# Altium footprint library 3D_MIG_Controller.PCBLIB: 560 footprints (part 18 of 35)
Each footprint in its own frame and in the unit in brackets; x right, y up, seen from the top. Pads: shape width x height; smd on the part's side, far side on the other; paste and mask are expansions set on the pad; w line width, h text height; cw(c..) or ccw(c..) is an arc to the next point about the centre after c.
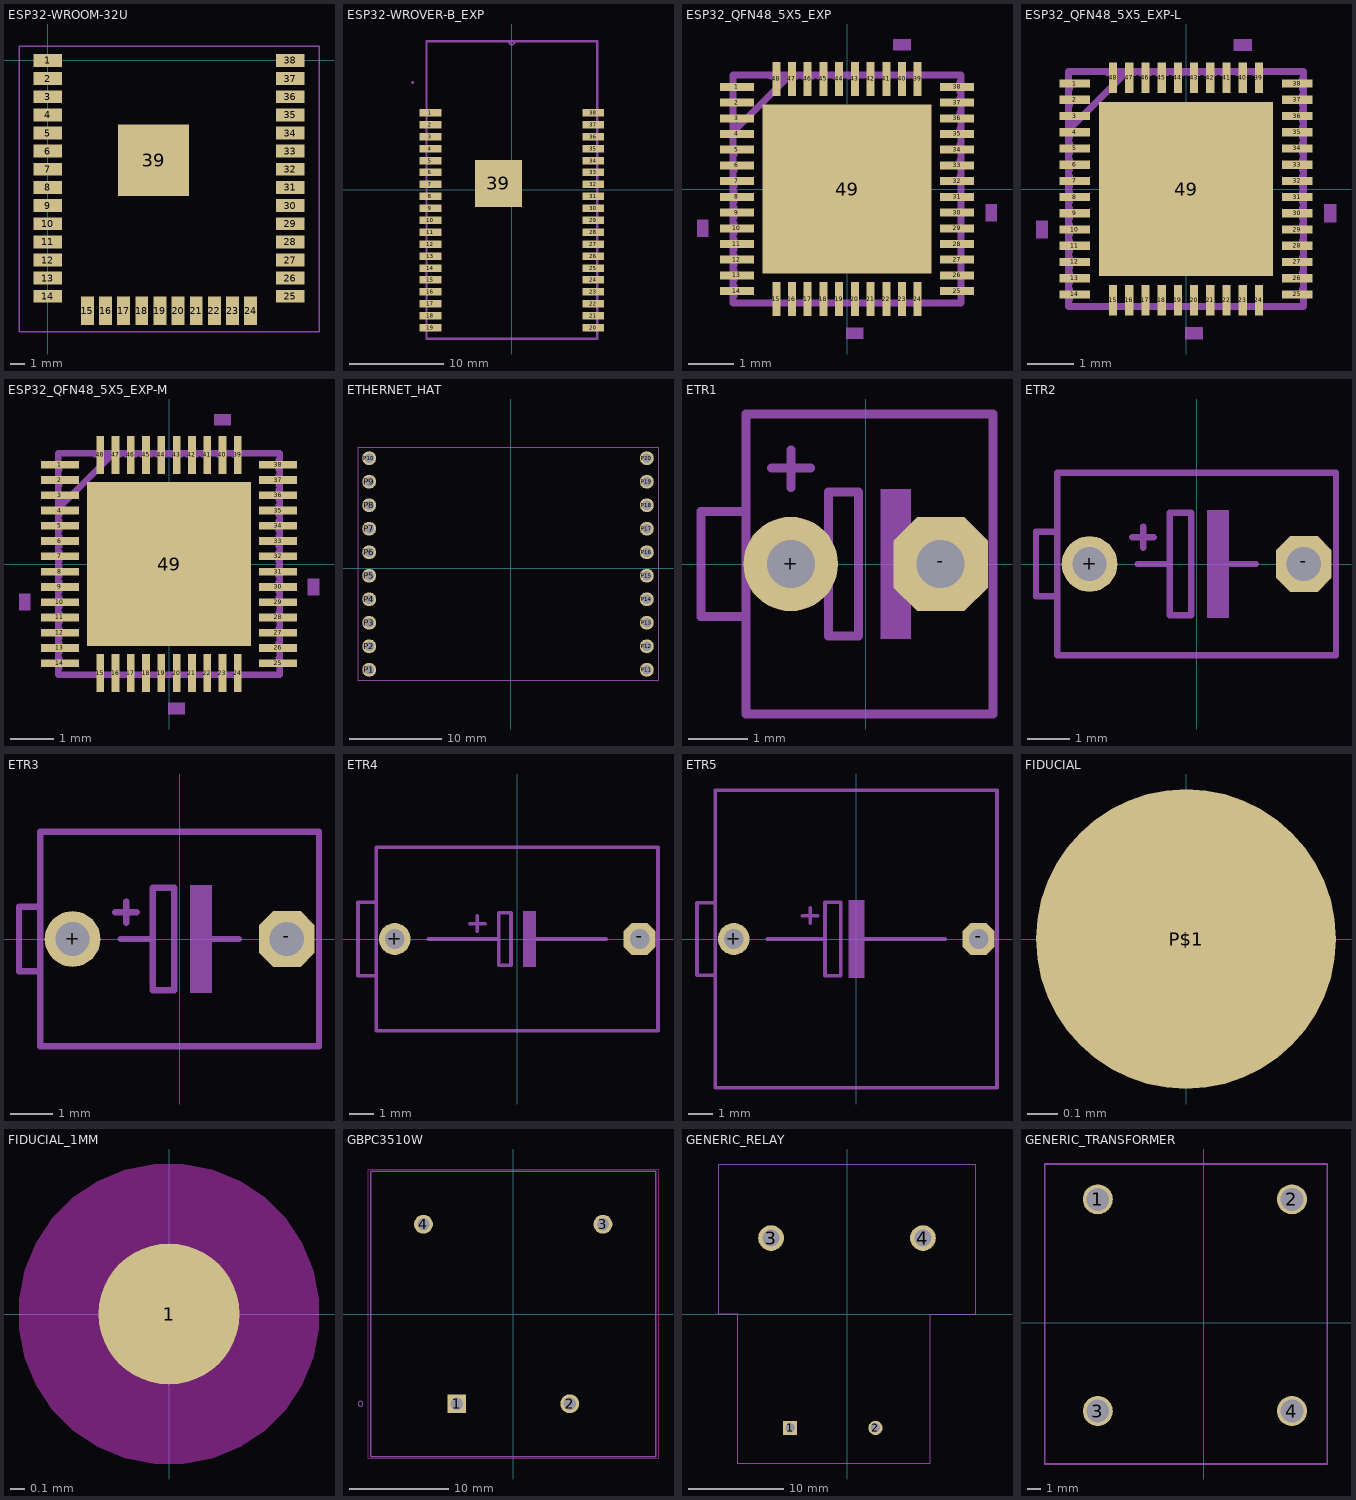
[diagram p17: the footprints below, top view; thin cyan lines are the x and y axes]

## ESP32-WROOM-32U [mm]
pads (39):
  rect 2x0.9 smd: 1(0,0) 2(0,-1.27) 3(0,-2.54) 4(0,-3.81) 5(0,-5.08) 6(0,-6.35) 7(0,-7.62) 8(0,-8.89) 9(0,-10.16) 10(0,-11.43) 11(0,-12.7) 12(0,-13.97) 13(0,-15.24) 14(0,-16.51) 25(17,-16.51) 26(17,-15.24) 27(17,-13.97) 28(17,-12.7) 29(17,-11.43) 30(17,-10.16) 31(17,-8.89) 32(17,-7.62) 33(17,-6.35) 34(17,-5.08) 35(17,-3.81) 36(17,-2.54) 37(17,-1.27) 38(17,0)
  rect 0.9x2 smd: 15(2.785,-17.51) 16(4.055,-17.51) 17(5.325,-17.51) 18(6.595,-17.51) 19(7.865,-17.51) 20(9.135,-17.51) 21(10.405,-17.51) 22(11.675,-17.51) 23(12.945,-17.51) 24(14.215,-17.51)
  rect 5x5 smd: 39(7.415,-7)
tPlace:
  lines w0.1: -2,-19 -2,1 19,1 19,-19 -2,-19
  text "*" at 1.7,-1.3 h2.6

## ESP32-WROVER-B_EXP [mm]
pads (39):
  rect 2.305x0.798 smd: 1(-8.653,8.21) 2(-8.653,6.94) 3(-8.653,5.67) 4(-8.653,4.4) 5(-8.653,3.13) 6(-8.653,1.86) 7(-8.653,0.59) 8(-8.653,-0.68) 9(-8.653,-1.95) 10(-8.653,-3.22) 11(-8.653,-4.49) 12(-8.653,-5.76) 13(-8.653,-7.03) 14(-8.653,-8.3) 15(-8.653,-9.57) 16(-8.653,-10.84) 17(-8.653,-12.11) 18(-8.653,-13.38) 19(-8.653,-14.65) 20(8.653,-14.65) 21(8.653,-13.38) 22(8.653,-12.11) 23(8.653,-10.84) 24(8.653,-9.57) 25(8.653,-8.3) 26(8.653,-7.03) 27(8.653,-5.76) 28(8.653,-4.49) 29(8.653,-3.22) 30(8.653,-1.95) 31(8.653,-0.68) 32(8.653,0.59) 33(8.653,1.86) 34(8.653,3.13) 35(8.653,4.4) 36(8.653,5.67) 37(8.653,6.94) 38(8.653,8.21)
  rect 5x5 smd paste+0: 39(-1.43,0.71)
Top Paste:
  region: -2.4,2.4 -2.4,0.933 -0.933,0.933 -0.933,2.4
  region: -2.4,0.733 -2.4,-0.733 -0.933,-0.733 -0.933,0.733
  region: -2.4,-0.933 -2.4,-2.4 -0.933,-2.4 -0.933,-0.933
  region: -0.733,2.4 -0.733,0.933 0.733,0.933 0.733,2.4
  region: -0.733,0.733 -0.733,-0.733 0.733,-0.733 0.733,0.733
  region: -0.733,-0.933 -0.733,-2.4 0.733,-2.4 0.733,-0.933
  region: 0.933,2.4 0.933,0.933 2.4,0.933 2.4,2.4
  region: 0.933,0.733 0.933,-0.733 2.4,-0.733 2.4,0.733
  region: 0.933,-0.933 0.933,-2.4 2.4,-2.4 2.4,-0.933
tDocu:
  lines w0.152: -0.305,15.748 0.305,15.748 ; -0.305,15.748 -9.042,15.748 -9.042,-15.748 9.042,-15.748 9.042,15.748 0.305,15.748 ; -0.305,15.748 ccw(c0,15.748) 0.305,15.748
  text "*" at -9.22,7.569 h1.97
tPlace:
  lines w0.152: -9.119,-15.037 -9.119,-15.85 9.119,-15.85 9.119,-15.037 ; -9.119,-14.249 -9.119,-13.767 ; -9.119,-12.979 -9.119,-12.497 ; -9.119,-11.709 -9.119,-11.227 ; -9.119,-10.439 -9.119,-9.957 ; -9.119,-9.169 -9.119,-8.687 ; -9.119,-7.899 -9.119,-7.417 ; -9.119,-6.629 -9.119,-6.147 ; -9.119,-5.359 -9.119,-4.877 ; -9.119,-4.089 -9.119,-3.607 ; -9.119,-2.819 -9.119,-2.337 ; -9.119,-1.549 -9.119,-1.067 ; -9.119,-0.279 -9.119,0.203 ; -9.119,0.991 -9.119,1.473 ; -9.119,2.261 -9.119,2.743 ; -9.119,3.531 -9.119,4.013 ; -9.119,4.801 -9.119,5.283 ; -9.119,6.071 -9.119,6.553 ; -9.119,7.341 -9.119,7.823 ; -9.119,8.611 -9.119,15.85 9.119,15.85 9.119,8.611 ; 9.119,-14.249 9.119,-13.767 ; 9.119,-12.979 9.119,-12.497 ; 9.119,-11.709 9.119,-11.227 ; 9.119,-10.439 9.119,-9.957 ; 9.119,-9.169 9.119,-8.687 ; 9.119,-7.899 9.119,-7.417 ; 9.119,-6.629 9.119,-6.147 ; 9.119,-5.359 9.119,-4.877 ; 9.119,-4.089 9.119,-3.607 ; 9.119,-2.819 9.119,-2.337 ; 9.119,-1.549 9.119,-1.067 ; 9.119,-0.279 9.119,0.203 ; 9.119,0.991 9.119,1.473 ; 9.119,2.261 9.119,2.743 ; 9.119,3.531 9.119,4.013 ; 9.119,4.801 9.119,5.283 ; 9.119,6.071 9.119,6.553 ; 9.119,7.341 9.119,7.823 ; -10.617,11.43 ccw(c-10.541,11.43) -10.465,11.43 ccw(c-10.541,11.43) -10.617,11.43
  text "*" at -9.22,7.569 h1.97
bPlace:
  text "*" at -9.22,7.569 h1.97

## ESP32_QFN48_5X5_EXP [mil]
pads (49):
  rect 30x7 smd: 1(-96.5,89.57) 2(-96.5,75.79) 3(-96.5,62.01) 4(-96.5,48.23) 5(-96.5,34.45) 6(-96.5,20.67) 7(-96.5,6.89) 8(-96.5,-6.89) 9(-96.5,-20.67) 10(-96.5,-34.45) 11(-96.5,-48.23) 12(-96.5,-62.01) 13(-96.5,-75.79) 14(-96.5,-89.57) 25(96.5,-89.57) 26(96.5,-75.79) 27(96.5,-62.01) 28(96.5,-48.23) 29(96.5,-34.45) 30(96.5,-20.67) 31(96.5,-6.89) 32(96.5,6.89) 33(96.5,20.67) 34(96.5,34.45) 35(96.5,48.23) 36(96.5,62.01) 37(96.5,75.79) 38(96.5,89.57)
  rect 7x30 smd: 15(-62.01,-96.5) 16(-48.23,-96.5) 17(-34.45,-96.5) 18(-20.67,-96.5) 19(-6.89,-96.5) 20(6.89,-96.5) 21(20.67,-96.5) 22(34.45,-96.5) 23(48.23,-96.5) 24(62.01,-96.5) 39(62.01,96.5) 40(48.23,96.5) 41(34.45,96.5) 42(20.67,96.5) 43(6.89,96.5) 44(-6.89,96.5) 45(-20.67,96.5) 46(-34.45,96.5) 47(-48.23,96.5) 48(-62.01,96.5)
  rect 148x148 smd paste+0: 49(0,0)
Top Paste:
  region: -70.06,70.06 -70.06,3.94 -3.94,3.94 -3.94,70.06
  region: -70.06,-3.94 -70.06,-70.06 -3.94,-70.06 -3.94,-3.94
  region: 3.94,70.06 3.94,3.94 70.06,3.94 70.06,70.06
  region: 3.94,-3.94 3.94,-70.06 70.06,-70.06 70.06,-3.94
tDocu:
  lines w6: -100,11 -99,2 ; -100,25 -99,16 ; -100,39 -99,30 ; -100,44 -100,53 ; -100,50 -50,100 ; -100,58 -100,67 ; -100,71 -100,80 ; -100,85 -100,94 ; -99,-94 -99,-85 ; -99,-80 -99,-71 ; -99,-67 -99,-58 ; -99,-53 -99,-44 ; -99,-39 -99,-30 ; -99,-25 -99,-16 ; -99,-11 -99,-2 ; -67,-100 -58,-100 ; -67,99 -58,99 ; -53,-100 -44,-100 ; -53,99 -44,99 ; -39,-100 -30,-100 ; -39,99 -30,99 ; -25,-100 -16,-100 ; -25,99 -16,100 ; -11,-100 -2,-100 ; -11,99 -2,100 ; 2,-100 11,-100 ; 2,99 11,100 ; 16,-100 25,-100 ; 16,100 25,100 ; 30,-100 39,-100 ; 30,100 39,100 ; 44,-100 53,-100 ; 44,100 53,100 ; 58,-100 67,-100 ; 58,100 67,100 ; 99,11 100,2 ; 99,25 100,16 ; 99,39 100,30 ; 99,53 100,44 ; 99,67 100,58 ; 99,80 100,71 ; 99,85 99,94 ; 100,-94 100,-85 ; 100,-80 100,-71 ; 100,-67 100,-58 ; 100,-53 100,-44 ; 100,-39 100,-30 ; 100,-25 100,-16 ; 100,-11 100,-2 ; -100,-100 100,-100 100,100 -100,100 -100,-100
  text "*" at -104,71 h77.5
tPlace:
  region: -131.5,-26.95 -131.5,-41.95 -121.5,-41.95 -121.5,-26.95
  region: -0.61,-121.5 -0.61,-131.5 14.39,-131.5 14.39,-121.5
  region: 131.5,-13.17 131.5,-28.17 121.5,-28.17 121.5,-13.17
  region: 40.73,121.5 40.73,131.5 55.73,131.5 55.73,121.5
  text "*" at -159,71 h77.5

## ESP32_QFN48_5X5_EXP-L [mil]
pads (49):
  rect 26x7 smd: 1(-94.5,89.57) 2(-94.5,75.79) 3(-94.5,62.01) 4(-94.5,48.23) 5(-94.5,34.45) 6(-94.5,20.67) 7(-94.5,6.89) 8(-94.5,-6.89) 9(-94.5,-20.67) 10(-94.5,-34.45) 11(-94.5,-48.23) 12(-94.5,-62.01) 13(-94.5,-75.79) 14(-94.5,-89.57) 25(94.5,-89.57) 26(94.5,-75.79) 27(94.5,-62.01) 28(94.5,-48.23) 29(94.5,-34.45) 30(94.5,-20.67) 31(94.5,-6.89) 32(94.5,6.89) 33(94.5,20.67) 34(94.5,34.45) 35(94.5,48.23) 36(94.5,62.01) 37(94.5,75.79) 38(94.5,89.57)
  rect 7x26 smd: 15(-62.01,-94.5) 16(-48.23,-94.5) 17(-34.45,-94.5) 18(-20.67,-94.5) 19(-6.89,-94.5) 20(6.89,-94.5) 21(20.67,-94.5) 22(34.45,-94.5) 23(48.23,-94.5) 24(62.01,-94.5) 39(62.01,94.5) 40(48.23,94.5) 41(34.45,94.5) 42(20.67,94.5) 43(6.89,94.5) 44(-6.89,94.5) 45(-20.67,94.5) 46(-34.45,94.5) 47(-48.23,94.5) 48(-62.01,94.5)
  rect 148x148 smd paste+0: 49(0,0)
Top Paste:
  region: -70.06,70.06 -70.06,3.94 -3.94,3.94 -3.94,70.06
  region: -70.06,-3.94 -70.06,-70.06 -3.94,-70.06 -3.94,-3.94
  region: 3.94,70.06 3.94,3.94 70.06,3.94 70.06,70.06
  region: 3.94,-3.94 3.94,-70.06 70.06,-70.06 70.06,-3.94
tDocu:
  lines w6: -100,50 -50,100 ; -100,67 -99,58 ; -100,80 -99,71 ; -100,94 -99,85 ; -99,-94 -99,-85 ; -99,-80 -99,-71 ; -99,-67 -99,-58 ; -99,-53 -99,-44 ; -99,-39 -99,-30 ; -99,-25 -99,-16 ; -99,-11 -99,-2 ; -99,2 -99,11 ; -99,16 -99,25 ; -99,30 -99,39 ; -99,44 -99,53 ; -67,-100 -58,-100 ; -67,99 -58,99 ; -53,-100 -44,-100 ; -53,99 -44,99 ; -39,-100 -30,-100 ; -39,99 -30,99 ; -25,-100 -16,-100 ; -25,99 -16,99 ; -11,-100 -2,-100 ; -11,99 -2,99 ; 2,-100 11,-100 ; 2,99 11,99 ; 16,-100 25,-100 ; 16,99 25,99 ; 30,-100 39,-100 ; 30,99 39,100 ; 44,-100 53,-100 ; 44,99 53,100 ; 58,-100 67,-100 ; 58,99 67,100 ; 99,-85 100,-94 ; 99,-71 100,-80 ; 99,-58 100,-67 ; 99,-44 100,-53 ; 99,-30 100,-39 ; 99,-25 99,-16 ; 99,-11 99,-2 ; 99,2 99,11 ; 99,16 99,25 ; 99,30 99,39 ; 99,44 99,53 ; 99,58 99,67 ; 99,71 99,80 ; 99,85 99,94 ; -100,-100 100,-100 100,100 -100,100 -100,-100
  text "*" at -104,71 h77.5
tPlace:
  region: -127.5,-26.95 -127.5,-41.95 -117.5,-41.95 -117.5,-26.95
  region: -0.61,-117.5 -0.61,-127.5 14.39,-127.5 14.39,-117.5
  region: 127.5,-13.17 127.5,-28.17 117.5,-28.17 117.5,-13.17
  region: 40.73,117.5 40.73,127.5 55.73,127.5 55.73,117.5
  text "*" at -155,71 h77.5

## ESP32_QFN48_5X5_EXP-M [mil]
pads (49):
  rect 34x7 smd: 1(-98.5,89.57) 2(-98.5,75.79) 3(-98.5,62.01) 4(-98.5,48.23) 5(-98.5,34.45) 6(-98.5,20.67) 7(-98.5,6.89) 8(-98.5,-6.89) 9(-98.5,-20.67) 10(-98.5,-34.45) 11(-98.5,-48.23) 12(-98.5,-62.01) 13(-98.5,-75.79) 14(-98.5,-89.57) 25(98.5,-89.57) 26(98.5,-75.79) 27(98.5,-62.01) 28(98.5,-48.23) 29(98.5,-34.45) 30(98.5,-20.67) 31(98.5,-6.89) 32(98.5,6.89) 33(98.5,20.67) 34(98.5,34.45) 35(98.5,48.23) 36(98.5,62.01) 37(98.5,75.79) 38(98.5,89.57)
  rect 7x34 smd: 15(-62.01,-98.5) 16(-48.23,-98.5) 17(-34.45,-98.5) 18(-20.67,-98.5) 19(-6.89,-98.5) 20(6.89,-98.5) 21(20.67,-98.5) 22(34.45,-98.5) 23(48.23,-98.5) 24(62.01,-98.5) 39(62.01,98.5) 40(48.23,98.5) 41(34.45,98.5) 42(20.67,98.5) 43(6.89,98.5) 44(-6.89,98.5) 45(-20.67,98.5) 46(-34.45,98.5) 47(-48.23,98.5) 48(-62.01,98.5)
  rect 148x148 smd paste+0: 49(0,0)
Top Paste:
  region: -70.06,70.06 -70.06,3.94 -3.94,3.94 -3.94,70.06
  region: -70.06,-3.94 -70.06,-70.06 -3.94,-70.06 -3.94,-3.94
  region: 3.94,70.06 3.94,3.94 70.06,3.94 70.06,70.06
  region: 3.94,-3.94 3.94,-70.06 70.06,-70.06 70.06,-3.94
tDocu:
  lines w6: -100,50 -50,100 ; -100,67 -99,58 ; -100,80 -99,71 ; -100,94 -99,85 ; -99,-94 -99,-85 ; -99,-80 -99,-71 ; -99,-67 -99,-58 ; -99,-53 -99,-44 ; -99,-39 -99,-30 ; -99,-25 -99,-16 ; -99,-11 -99,-2 ; -99,2 -99,11 ; -99,16 -99,25 ; -99,30 -99,39 ; -99,44 -99,53 ; -67,-100 -58,-100 ; -67,99 -58,99 ; -53,-100 -44,-100 ; -53,99 -44,99 ; -39,-100 -30,-100 ; -39,99 -30,99 ; -25,-100 -16,-100 ; -25,99 -16,99 ; -11,-100 -2,-100 ; -11,99 -2,99 ; 2,-100 11,-100 ; 2,99 11,99 ; 16,-100 25,-100 ; 16,99 25,99 ; 30,-100 39,-100 ; 30,99 39,100 ; 44,-100 53,-100 ; 44,99 53,100 ; 58,-100 67,-100 ; 58,99 67,100 ; 99,-85 100,-94 ; 99,-71 100,-80 ; 99,-58 100,-67 ; 99,-44 100,-53 ; 99,-30 100,-39 ; 99,-25 99,-16 ; 99,-11 99,-2 ; 99,2 99,11 ; 99,16 99,25 ; 99,30 99,39 ; 99,44 99,53 ; 99,58 99,67 ; 99,71 99,80 ; 99,85 99,94 ; -100,-100 100,-100 100,100 -100,100 -100,-100
  text "*" at -104,71 h77.5
tPlace:
  region: -135.5,-26.95 -135.5,-41.95 -125.5,-41.95 -125.5,-26.95
  region: -0.61,-125.5 -0.61,-135.5 14.39,-135.5 14.39,-125.5
  region: 135.5,-13.17 135.5,-28.17 125.5,-28.17 125.5,-13.17
  region: 40.73,125.5 40.73,135.5 55.73,135.5 55.73,125.5
  text "*" at -163,71 h77.5

## ETHERNET_HAT [mm]
pads (20):
  round 1.508 hole 1: P1(-15.3,-10.96) P2(-15.3,-8.42) P3(-15.3,-5.88) P4(-15.3,-3.34) P5(-15.3,-0.8) P6(-15.3,1.74) P7(-15.3,4.28) P8(-15.3,6.82) P9(-15.3,9.36) P10(-15.3,11.9) P11(14.7,-10.96) P12(14.7,-8.42) P13(14.7,-5.88) P14(14.7,-3.34) P15(14.7,-0.8) P16(14.7,1.74) P17(14.7,4.28) P18(14.7,6.82) P19(14.7,9.36) P20(14.7,11.9)
tPlace:
  lines w0.127: -16.508,-12.168 15.908,-12.168 15.908,13.108 -16.508,13.108 -16.508,-12.168

## ETR1 [mil]
pads (2):
  round 63 hole 32: +(-50,0)
  oct 63x63 / inner round 58.2 / far side oct 63x63 hole 32: -(50,0)
tDocu:
  region: 10,-50 10,50 30,50 30,-50
  lines w6: -80,-35 -80,35 ; -65,0 -25,0 ; 25,0 65,0 ; 85,-25 85,25 ; -25,0 -25,-48 -5,-48 -5,48 -25,48 -25,0
tPlace:
  lines w6: -63,64 -37,64 ; -50,51 -50,76 ; 85,-25 85,-100 -80,-100 -80,-35 -110,-35 -110,35 -80,35 -80,100 85,100 85,25

## ETR2 [mil]
pads (2):
  round 52 hole 32: +(-100,0)
  oct 52x52 / inner round 48.04 / far side oct 52x52 hole 32: -(100,0)
tDocu:
  lines w6: -130,-30 -130,30 ; 130,-30 130,30
tPlace:
  region: 10,-50 10,50 30,50 30,-50
  lines w6: -60,25 -40,25 ; -55,0 -25,0 ; -50,15 -50,35 ; 25,0 55,0 ; 130,-30 130,-85 -130,-85 -130,-30 -150,-30 -150,30 -130,30 -130,85 130,85 130,30 ; -25,0 -25,-48 -5,-48 -5,48 -25,48 -25,0

## ETR3 [mil]
pads (2):
  round 52 hole 32: +(-100,0)
  oct 52x52 / inner round 48.04 / far side oct 52x52 hole 32: -(100,0)
tDocu:
  lines w6: -130,-30 -130,30 ; 130,-30 130,30
tPlace:
  region: 10,-50 10,50 30,50 30,-50
  lines w6: -60,25 -40,25 ; -55,0 -25,0 ; -50,15 -50,35 ; 25,0 55,0 ; 130,-30 130,-100 -130,-100 -130,-30 -150,-30 -150,30 -130,30 -130,100 130,100 130,30 ; -25,0 -25,-48 -5,-48 -5,48 -25,48 -25,0

## ETR4 [mil]
pads (2):
  round 52 hole 32: +(-200,0)
  oct 52x52 / inner round 48.04 / far side oct 52x52 hole 32: -(200,0)
tDocu:
  lines w6: -230,-60 -230,60 ; 230,-30 230,30
tPlace:
  region: 10,-45 10,45 30,45 30,-45
  lines w6: -145,0 -30,0 ; -77,25 -52,25 ; -65,13 -65,38 ; 20,0 145,0 ; 230,-30 230,-150 -230,-150 -230,-60 -260,-60 -260,60 -230,60 -230,150 230,150 230,30 ; -30,0 -30,43 -10,43 -10,-43 -30,-43 -30,0

## ETR5 [mil]
pads (2):
  round 52 hole 32: +(-200,0)
  oct 52x52 / inner round 48.04 / far side oct 52x52 hole 32: -(200,0)
tDocu:
  lines w6: -230,-59 -230,59 ; 230,-35 230,35
tPlace:
  region: -12,-63 -12,63 13,63 13,-63
  lines w6: -145,0 -51,0 ; -88,38 -63,38 ; -75,26 -75,51 ; 0,0 145,0 ; 230,-35 230,-243 -230,-243 -230,-59 -260,-59 -260,59 -230,59 -230,243 230,243 230,35 ; -51,0 -51,60 -25,60 -25,-60 -51,-60 -51,0

## FIDUCIAL [mm]
pads (1):
  rrect100% 1x1 smd: P$1(0,0)

## FIDUCIAL_1MM [mm]
pads (1):
  rrect100% 1x1 smd paste+0 mask+0: 1(0,0)
Top keep-out:
  region: -1.063,0 -1.063,-0.105 -1.023,-0.31 -0.942,-0.504 -0.826,-0.678 -0.678,-0.826 -0.504,-0.942 -0.31,-1.023 -0.105,-1.063 0,-1.063 0.105,-1.063 0.31,-1.023 0.504,-0.942 0.678,-0.826 0.826,-0.678 0.942,-0.504 1.023,-0.31 1.063,-0.105 1.063,0 1.063,0.105 1.023,0.31 0.942,0.504 0.826,0.678 0.678,0.826 0.504,0.942 0.31,1.023 0.105,1.063 0,1.063 -0.105,1.063 -0.31,1.023 -0.504,0.942 -0.678,0.826 -0.826,0.678 -0.942,0.504 -1.023,0.31 -1.063,0.105
Top Solder:
  region: -1.063,0 -1.063,-0.105 -1.023,-0.31 -0.942,-0.504 -0.826,-0.678 -0.678,-0.826 -0.504,-0.942 -0.31,-1.023 -0.105,-1.063 0,-1.063 0.105,-1.063 0.31,-1.023 0.504,-0.942 0.678,-0.826 0.826,-0.678 0.942,-0.504 1.023,-0.31 1.063,-0.105 1.063,0 1.063,0.105 1.023,0.31 0.942,0.504 0.826,0.678 0.678,0.826 0.504,0.942 0.31,1.023 0.105,1.063 0,1.063 -0.105,1.063 -0.31,1.023 -0.504,0.942 -0.678,0.826 -0.826,0.678 -0.942,0.504 -1.023,0.31 -1.063,0.105

## GBPC3510W [mm]
pads (4):
  rect 1.9x1.9 / inner round 1.755 / far side rect 1.9x1.9 hole 1.25: 1(-5.7,-9.05)
  round 1.9 hole 1.25: 2(5.7,-9.05) 3(9.05,9.05) 4(-9.05,9.05)
Top keep-out:
  lines w0.1: -14.6,-14.6 -14.6,14.6 14.6,14.6 14.6,-14.6 -14.6,-14.6
tDocu:
  lines w0.15: -14.375,-14.375 -14.375,14.375 14.375,14.375 14.375,-14.375 -14.375,-14.375
tPlace:
  circle w0: c-15.4,-9.05 r0.25
  lines w0.15: -14.375,-14.375 -14.375,14.375 14.375,14.375 14.375,-14.375 -14.375,-14.375

## GENERIC_RELAY [mm]
pads (4):
  rect 1.508x1.508 / inner round 1.393 / far side rect 1.508x1.508 hole 1: 1(-6,-12)
  round 1.508 hole 1: 2(3,-12)
  round 2.7 hole 1.8: 3(-8,8) 4(8,8)
tPlace:
  lines w0.127: -13.5,0 -11.5,0 -11.5,-15.8 8.7,-15.8 8.7,-0.1 13.5,-0.1 13.5,15.8 -13.5,15.8 -13.5,0

## GENERIC_TRANSFORMER [mil]
pads (4):
  round 85 hole 65: 1(-300,350) 2(250,350) 3(-300,-250) 4(250,-250)
tPlace:
  lines w5: -450,-400 -450,450 350,450 350,-400 -450,-400
  text "Primary" at -150,250 h77.5
  text "Secondary" at -200,-200 h77.5